# Altium footprint library NXP_60_26022015.PCBLIB: 287 footprints (part 15 of 18)
Each footprint in its own frame and in the unit in brackets; x right, y up, seen from the top. Pads: shape width x height; smd on the part's side, far side on the other; paste and mask are expansions set on the pad; w line width, h text height; cw(c..) or ccw(c..) is an arc to the next point about the centre after c.
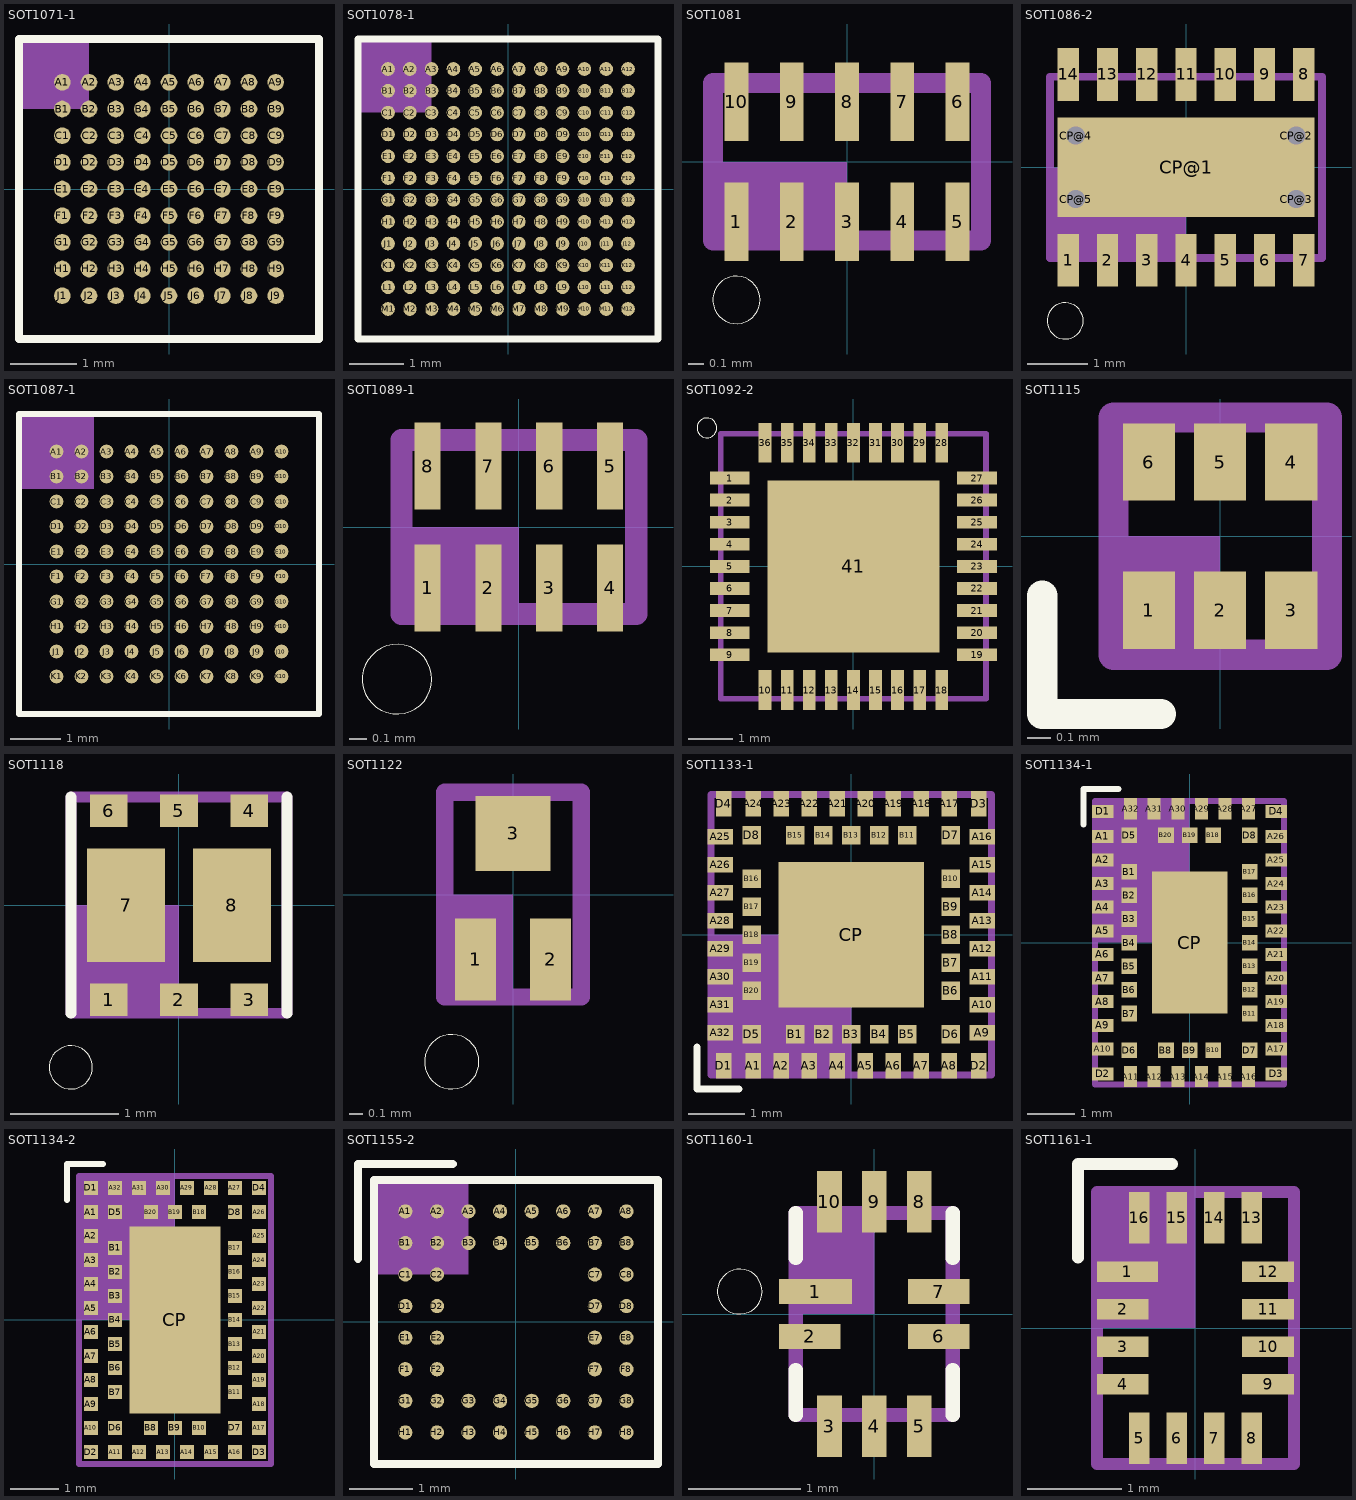
[diagram p14: the footprints below, top view; thin cyan lines are the x and y axes]

## SOT1071-1 [mil]
pads (81):
  rrect100% 9.84x9.84 smd: A1(-62.99,62.99) A2(-47.24,62.99) A3(-31.5,62.99) A4(-15.75,62.99) A5(0,62.99) A6(15.75,62.99) A7(31.5,62.99) A8(47.24,62.99) A9(62.99,62.99) B1(-62.99,47.24) B2(-47.24,47.24) B3(-31.5,47.24) B4(-15.75,47.24) B5(0,47.24) B6(15.75,47.24) B7(31.5,47.24) B8(47.24,47.24) B9(62.99,47.24) C1(-62.99,31.5) C2(-47.24,31.5) C3(-31.5,31.5) C4(-15.75,31.5) C5(0,31.5) C6(15.75,31.5) C7(31.5,31.5) C8(47.24,31.5) C9(62.99,31.5) D1(-62.99,15.75) D2(-47.24,15.75) D3(-31.5,15.75) D4(-15.75,15.75) D5(0,15.75) D6(15.75,15.75) D7(31.5,15.75) D8(47.24,15.75) D9(62.99,15.75) E1(-62.99,0) E2(-47.24,0) E3(-31.5,0) E4(-15.75,0) E5(0,0) E6(15.75,0) E7(31.5,0) E8(47.24,0) E9(62.99,0) F1(-62.99,-15.75) F2(-47.24,-15.75) F3(-31.5,-15.75) F4(-15.75,-15.75) F5(0,-15.75) F6(15.75,-15.75) F7(31.5,-15.75) F8(47.24,-15.75) F9(62.99,-15.75) G1(-62.99,-31.5) G2(-47.24,-31.5) G3(-31.5,-31.5) G4(-15.75,-31.5) G5(0,-31.5) G6(15.75,-31.5) G7(31.5,-31.5) G8(47.24,-31.5) G9(62.99,-31.5) H1(-62.99,-47.24) H2(-47.24,-47.24) H3(-31.5,-47.24) H4(-15.75,-47.24) H5(0,-47.24) H6(15.75,-47.24) H7(31.5,-47.24) H8(47.24,-47.24) H9(62.99,-47.24) J1(-62.99,-62.99) J2(-47.24,-62.99) J3(-31.5,-62.99) J4(-15.75,-62.99) J5(0,-62.99) J6(15.75,-62.99) J7(31.5,-62.99) J8(47.24,-62.99) J9(62.99,-62.99)
Top Overlay:
  lines w5: -88.58,-88.58 -88.58,88.58 88.58,88.58 88.58,-88.58 -88.58,-88.58
Top Paste:
  circle w0: c62.99,-62.99 r5.41
  circle w0: c62.99,-47.24 r5.41
  circle w0: c62.99,-31.5 r5.41
  circle w0: c62.99,-15.75 r5.41
  circle w0: c62.99,0 r5.41
  circle w0: c62.99,15.75 r5.41
  circle w0: c62.99,31.5 r5.41
  circle w0: c62.99,47.24 r5.41
  circle w0: c62.99,62.99 r5.41
  circle w0: c47.24,62.99 r5.41
  circle w0: c31.5,62.99 r5.41
  circle w0: c15.75,62.99 r5.41
  circle w0: c0,62.99 r5.41
  circle w0: c-15.75,62.99 r5.41
  circle w0: c-31.5,62.99 r5.41
  circle w0: c-47.24,62.99 r5.41
  circle w0: c-62.99,62.99 r5.41
  circle w0: c47.24,47.24 r5.41
  circle w0: c31.5,47.24 r5.41
  circle w0: c15.75,47.24 r5.41
  circle w0: c0,47.24 r5.41
  circle w0: c-15.75,47.24 r5.41
  circle w0: c-31.5,47.24 r5.41
  circle w0: c-47.24,47.24 r5.41
  circle w0: c-62.99,47.24 r5.41
  circle w0: c47.24,31.5 r5.41
  circle w0: c31.5,31.5 r5.41
  circle w0: c15.75,31.5 r5.41
  circle w0: c0,31.5 r5.41
  circle w0: c-15.75,31.5 r5.41
  circle w0: c-31.5,31.5 r5.41
  circle w0: c-47.24,31.5 r5.41
  circle w0: c-62.99,31.5 r5.41
  circle w0: c47.24,15.75 r5.41
  circle w0: c31.5,15.75 r5.41
  circle w0: c15.75,15.75 r5.41
  circle w0: c0,15.75 r5.41
  circle w0: c-15.75,15.75 r5.41
  circle w0: c-31.5,15.75 r5.41
  circle w0: c-47.24,15.75 r5.41
  circle w0: c-62.99,15.75 r5.41
  circle w0: c47.24,0 r5.41
  circle w0: c31.5,0 r5.41
  circle w0: c15.75,0 r5.41
  circle w0: c0,0 r5.41
  circle w0: c-15.75,0 r5.41
  circle w0: c-31.5,0 r5.41
  circle w0: c-47.24,0 r5.41
  circle w0: c-62.99,0 r5.41
  circle w0: c47.24,-15.75 r5.41
  circle w0: c31.5,-15.75 r5.41
  circle w0: c15.75,-15.75 r5.41
  circle w0: c0,-15.75 r5.41
  circle w0: c-15.75,-15.75 r5.41
  circle w0: c-31.5,-15.75 r5.41
  circle w0: c-47.24,-15.75 r5.41
  circle w0: c-62.99,-15.75 r5.41
  circle w0: c47.24,-31.5 r5.41
  circle w0: c31.5,-31.5 r5.41
  circle w0: c15.75,-31.5 r5.41
  circle w0: c0,-31.5 r5.41
  circle w0: c-15.75,-31.5 r5.41
  circle w0: c-31.5,-31.5 r5.41
  circle w0: c-47.24,-31.5 r5.41
  circle w0: c-62.99,-31.5 r5.41
  circle w0: c47.24,-47.24 r5.41
  circle w0: c31.5,-47.24 r5.41
  circle w0: c15.75,-47.24 r5.41
  circle w0: c0,-47.24 r5.41
  circle w0: c-15.75,-47.24 r5.41
  circle w0: c-31.5,-47.24 r5.41
  circle w0: c-47.24,-47.24 r5.41
  circle w0: c-62.99,-47.24 r5.41
  circle w0: c47.24,-62.99 r5.41
  circle w0: c31.5,-62.99 r5.41
  circle w0: c15.75,-62.99 r5.41
  circle w0: c0,-62.99 r5.41
  circle w0: c-15.75,-62.99 r5.41
  circle w0: c-31.5,-62.99 r5.41
  circle w0: c-47.24,-62.99 r5.41
  circle w0: c-62.99,-62.99 r5.41
Top Solder:
  circle w0: c-62.99,62.99 r6.89
  circle w0: c-47.24,62.99 r6.89
  circle w0: c-31.5,62.99 r6.89
  circle w0: c-15.75,62.99 r6.89
  circle w0: c0,62.99 r6.89
  circle w0: c15.75,62.99 r6.89
  circle w0: c31.5,62.99 r6.89
  circle w0: c47.24,62.99 r6.89
  circle w0: c-62.99,47.24 r6.89
  circle w0: c-47.24,47.24 r6.89
  circle w0: c-31.5,47.24 r6.89
  circle w0: c-15.75,47.24 r6.89
  circle w0: c0,47.24 r6.89
  circle w0: c15.75,47.24 r6.89
  circle w0: c31.5,47.24 r6.89
  circle w0: c47.24,47.24 r6.89
  circle w0: c-62.99,31.5 r6.89
  circle w0: c-62.99,15.75 r6.89
  circle w0: c-62.99,0 r6.89
  circle w0: c-62.99,-15.75 r6.89
  circle w0: c-62.99,-31.5 r6.89
  circle w0: c-62.99,-47.24 r6.89
  circle w0: c-47.24,31.5 r6.89
  circle w0: c-47.24,15.75 r6.89
  circle w0: c-47.24,0 r6.89
  circle w0: c-47.24,-15.75 r6.89
  circle w0: c-47.24,-31.5 r6.89
  circle w0: c-47.24,-47.24 r6.89
  circle w0: c-31.5,-31.5 r6.89
  circle w0: c-31.5,-47.24 r6.89
  circle w0: c-15.75,-31.5 r6.89
  circle w0: c-15.75,-47.24 r6.89
  circle w0: c0,-31.5 r6.89
  circle w0: c0,-47.24 r6.89
  circle w0: c15.75,-31.5 r6.89
  circle w0: c15.75,-47.24 r6.89
  circle w0: c31.5,-31.5 r6.89
  circle w0: c31.5,-47.24 r6.89
  circle w0: c47.24,-31.5 r6.89
  circle w0: c47.24,-47.24 r6.89
  circle w0: c31.5,31.5 r6.89
  circle w0: c31.5,15.75 r6.89
  circle w0: c47.24,31.5 r6.89
  circle w0: c47.24,15.75 r6.89
  circle w0: c31.5,0 r6.89
  circle w0: c31.5,-15.75 r6.89
  circle w0: c47.24,0 r6.89
  circle w0: c47.24,-15.75 r6.89
  circle w0: c62.99,62.99 r6.89
  circle w0: c62.99,47.24 r6.89
  circle w0: c62.99,-31.5 r6.89
  circle w0: c62.99,-47.24 r6.89
  circle w0: c62.99,31.5 r6.89
  circle w0: c62.99,15.75 r6.89
  circle w0: c62.99,0 r6.89
  circle w0: c62.99,-15.75 r6.89
  circle w0: c-62.99,-62.99 r6.89
  circle w0: c-31.5,31.5 r6.89
  circle w0: c-31.5,15.75 r6.89
  circle w0: c-31.5,0 r6.89
  circle w0: c-31.5,-15.75 r6.89
  circle w0: c-15.75,31.5 r6.89
  circle w0: c0,31.5 r6.89
  circle w0: c15.75,31.5 r6.89
  circle w0: c-15.75,15.75 r6.89
  circle w0: c-15.75,0 r6.89
  circle w0: c-15.75,-15.75 r6.89
  circle w0: c0,15.75 r6.89
  circle w0: c0,0 r6.89
  circle w0: c0,-15.75 r6.89
  circle w0: c15.75,15.75 r6.89
  circle w0: c15.75,0 r6.89
  circle w0: c15.75,-15.75 r6.89
  circle w0: c-47.24,-62.99 r6.89
  circle w0: c-31.5,-62.99 r6.89
  circle w0: c-15.75,-62.99 r6.89
  circle w0: c0,-62.99 r6.89
  circle w0: c15.75,-62.99 r6.89
  circle w0: c31.5,-62.99 r6.89
  circle w0: c47.24,-62.99 r6.89
  circle w0: c62.99,-62.99 r6.89
Mechanical 16:
  rectangle: -88.58,47.24 -47.24,88.58

## SOT1078-1 [mm]
pads (144):
  rrect100% 0.25x0.25 smd: A1(-2.2,2.2) A2(-1.8,2.2) A3(-1.4,2.2) A4(-1,2.2) A5(-0.6,2.2) A6(-0.2,2.2) A7(0.2,2.2) A8(0.6,2.2) A9(1,2.2) A10(1.4,2.2) A11(1.8,2.2) A12(2.2,2.2) B1(-2.2,1.8) B2(-1.8,1.8) B3(-1.4,1.8) B4(-1,1.8) B5(-0.6,1.8) B6(-0.2,1.8) B7(0.2,1.8) B8(0.6,1.8) B9(1,1.8) B10(1.4,1.8) B11(1.8,1.8) B12(2.2,1.8) C1(-2.2,1.4) C2(-1.8,1.4) C3(-1.4,1.4) C4(-1,1.4) C5(-0.6,1.4) C6(-0.2,1.4) C7(0.2,1.4) C8(0.6,1.4) C9(1,1.4) C10(1.4,1.4) C11(1.8,1.4) C12(2.2,1.4) D1(-2.2,1) D2(-1.8,1) D3(-1.4,1) D4(-1,1) D5(-0.6,1) D6(-0.2,1) D7(0.2,1) D8(0.6,1) D9(1,1) D10(1.4,1) D11(1.8,1) D12(2.2,1) E1(-2.2,0.6) E2(-1.8,0.6) E3(-1.4,0.6) E4(-1,0.6) E5(-0.6,0.6) E6(-0.2,0.6) E7(0.2,0.6) E8(0.6,0.6) E9(1,0.6) E10(1.4,0.6) E11(1.8,0.6) E12(2.2,0.6) F1(-2.2,0.2) F2(-1.8,0.2) F3(-1.4,0.2) F4(-1,0.2) F5(-0.6,0.2) F6(-0.2,0.2) F7(0.2,0.2) F8(0.6,0.2) F9(1,0.2) F10(1.4,0.2) F11(1.8,0.2) F12(2.2,0.2) G1(-2.2,-0.2) G2(-1.8,-0.2) G3(-1.4,-0.2) G4(-1,-0.2) G5(-0.6,-0.2) G6(-0.2,-0.2) G7(0.2,-0.2) G8(0.6,-0.2) G9(1,-0.2) G10(1.4,-0.2) G11(1.8,-0.2) G12(2.2,-0.2) H1(-2.2,-0.6) H2(-1.8,-0.6) H3(-1.4,-0.6) H4(-1,-0.6) H5(-0.6,-0.6) H6(-0.2,-0.6) H7(0.2,-0.6) H8(0.6,-0.6) H9(1,-0.6) H10(1.4,-0.6) H11(1.8,-0.6) H12(2.2,-0.6) J1(-2.2,-1) J2(-1.8,-1) J3(-1.4,-1) J4(-1,-1) J5(-0.6,-1) J6(-0.2,-1) J7(0.2,-1) J8(0.6,-1) J9(1,-1) J10(1.4,-1) J11(1.8,-1) J12(2.2,-1) K1(-2.2,-1.4) K2(-1.8,-1.4) K3(-1.4,-1.4) K4(-1,-1.4) K5(-0.6,-1.4) K6(-0.2,-1.4) K7(0.2,-1.4) K8(0.6,-1.4) K9(1,-1.4) K10(1.4,-1.4) K11(1.8,-1.4) K12(2.2,-1.4) L1(-2.2,-1.8) L2(-1.8,-1.8) L3(-1.4,-1.8) L4(-1,-1.8) L5(-0.6,-1.8) L6(-0.2,-1.8) L7(0.2,-1.8) L8(0.6,-1.8) L9(1,-1.8) L10(1.4,-1.8) L11(1.8,-1.8) L12(2.2,-1.8) M1(-2.2,-2.2) M2(-1.8,-2.2) M3(-1.4,-2.2) M4(-1,-2.2) M5(-0.6,-2.2) M6(-0.2,-2.2) M7(0.2,-2.2) M8(0.6,-2.2) M9(1,-2.2) M10(1.4,-2.2) M11(1.8,-2.2) M12(2.2,-2.2)
Top Overlay:
  lines w0.127: -2.75,-2.75 -2.75,2.75 2.75,2.75 2.75,-2.75 -2.75,-2.75
Top Paste:
  circle w0: c-2.2,2.2 r0.137
  circle w0: c-1.8,2.2 r0.137
  circle w0: c-1.4,2.2 r0.137
  circle w0: c-1,2.2 r0.137
  circle w0: c-0.6,2.2 r0.137
  circle w0: c-0.2,2.2 r0.137
  circle w0: c2.2,2.2 r0.137
  circle w0: c1.8,2.2 r0.137
  circle w0: c1.4,2.2 r0.137
  circle w0: c1,2.2 r0.137
  circle w0: c0.6,2.2 r0.137
  circle w0: c0.2,2.2 r0.137
  circle w0: c-2.2,1.8 r0.137
  circle w0: c-1.8,1.8 r0.137
  circle w0: c-1.4,1.8 r0.137
  circle w0: c-1,1.8 r0.137
  circle w0: c-0.6,1.8 r0.137
  circle w0: c-0.2,1.8 r0.137
  circle w0: c2.2,1.8 r0.137
  circle w0: c1.8,1.8 r0.137
  circle w0: c1.4,1.8 r0.137
  circle w0: c1,1.8 r0.137
  circle w0: c0.6,1.8 r0.137
  circle w0: c0.2,1.8 r0.137
  circle w0: c-2.2,1.4 r0.137
  circle w0: c-1.8,1.4 r0.137
  circle w0: c-1.4,1.4 r0.137
  circle w0: c-1,1.4 r0.137
  circle w0: c-0.6,1.4 r0.137
  circle w0: c-0.2,1.4 r0.137
  circle w0: c2.2,1.4 r0.137
  circle w0: c1.8,1.4 r0.137
  circle w0: c1.4,1.4 r0.137
  circle w0: c1,1.4 r0.137
  circle w0: c0.6,1.4 r0.137
  circle w0: c0.2,1.4 r0.137
  circle w0: c-2.2,1 r0.137
  circle w0: c-1.8,1 r0.137
  circle w0: c-1.4,1 r0.137
  circle w0: c-1,1 r0.137
  circle w0: c-0.6,1 r0.137
  circle w0: c-0.2,1 r0.137
  circle w0: c2.2,1 r0.137
  circle w0: c1.8,1 r0.137
  circle w0: c1.4,1 r0.137
  circle w0: c1,1 r0.137
  circle w0: c0.6,1 r0.137
  circle w0: c0.2,1 r0.137
  circle w0: c-2.2,0.6 r0.137
  circle w0: c-1.8,0.6 r0.137
  circle w0: c-1.4,0.6 r0.137
  circle w0: c-1,0.6 r0.137
  circle w0: c-0.6,0.6 r0.137
  circle w0: c-0.2,0.6 r0.137
  circle w0: c2.2,0.6 r0.137
  circle w0: c1.8,0.6 r0.137
  circle w0: c1.4,0.6 r0.137
  circle w0: c1,0.6 r0.137
  circle w0: c0.6,0.6 r0.137
  circle w0: c0.2,0.6 r0.137
  circle w0: c-2.2,0.2 r0.137
  circle w0: c-1.8,0.2 r0.137
  circle w0: c-1.4,0.2 r0.137
  circle w0: c-1,0.2 r0.137
  circle w0: c-0.6,0.2 r0.137
  circle w0: c-0.2,0.2 r0.137
  circle w0: c2.2,0.2 r0.137
  circle w0: c1.8,0.2 r0.137
  circle w0: c1.4,0.2 r0.137
  circle w0: c1,0.2 r0.137
  circle w0: c0.6,0.2 r0.137
  circle w0: c0.2,0.2 r0.137
  circle w0: c-2.2,-0.2 r0.137
  circle w0: c-1.8,-0.2 r0.137
  circle w0: c-1.4,-0.2 r0.137
  circle w0: c-1,-0.2 r0.137
  circle w0: c-0.6,-0.2 r0.137
  circle w0: c-0.2,-0.2 r0.137
  circle w0: c2.2,-0.2 r0.137
  circle w0: c1.8,-0.2 r0.137
  circle w0: c1.4,-0.2 r0.137
  circle w0: c1,-0.2 r0.137
  circle w0: c0.6,-0.2 r0.137
  circle w0: c0.2,-0.2 r0.137
  circle w0: c-2.2,-0.6 r0.137
  circle w0: c-1.8,-0.6 r0.137
  circle w0: c-1.4,-0.6 r0.137
  circle w0: c-1,-0.6 r0.137
  circle w0: c-0.6,-0.6 r0.137
  circle w0: c-0.2,-0.6 r0.137
  circle w0: c2.2,-0.6 r0.137
  circle w0: c1.8,-0.6 r0.137
  circle w0: c1.4,-0.6 r0.137
  circle w0: c1,-0.6 r0.137
  circle w0: c0.6,-0.6 r0.137
  circle w0: c0.2,-0.6 r0.137
  circle w0: c-2.2,-1 r0.137
  circle w0: c-1.8,-1 r0.137
  circle w0: c-1.4,-1 r0.137
  circle w0: c-1,-1 r0.137
  circle w0: c-0.6,-1 r0.137
  circle w0: c-0.2,-1 r0.137
  circle w0: c2.2,-1 r0.137
  circle w0: c1.8,-1 r0.137
  circle w0: c1.4,-1 r0.137
  circle w0: c1,-1 r0.137
  circle w0: c0.6,-1 r0.137
  circle w0: c0.2,-1 r0.137
  circle w0: c-2.2,-1.4 r0.137
  circle w0: c-1.8,-1.4 r0.137
  circle w0: c-1.4,-1.4 r0.137
  circle w0: c-1,-1.4 r0.137
  circle w0: c-0.6,-1.4 r0.137
  circle w0: c-0.2,-1.4 r0.137
  circle w0: c2.2,-1.4 r0.137
  circle w0: c1.8,-1.4 r0.137
  circle w0: c1.4,-1.4 r0.137
  circle w0: c1,-1.4 r0.137
  circle w0: c0.6,-1.4 r0.137
  circle w0: c0.2,-1.4 r0.137
  circle w0: c-2.2,-1.8 r0.137
  circle w0: c-1.8,-1.8 r0.137
  circle w0: c-1.4,-1.8 r0.137
  circle w0: c-1,-1.8 r0.137
  circle w0: c-0.6,-1.8 r0.137
  circle w0: c-0.2,-1.8 r0.137
  circle w0: c2.2,-1.8 r0.137
  circle w0: c1.8,-1.8 r0.137
  circle w0: c1.4,-1.8 r0.137
  circle w0: c1,-1.8 r0.137
  circle w0: c0.6,-1.8 r0.137
  circle w0: c0.2,-1.8 r0.137
  circle w0: c-2.2,-2.2 r0.137
  circle w0: c-1.8,-2.2 r0.137
  circle w0: c-1.4,-2.2 r0.137
  circle w0: c-1,-2.2 r0.137
  circle w0: c-0.6,-2.2 r0.137
  circle w0: c-0.2,-2.2 r0.137
  circle w0: c2.2,-2.2 r0.137
  circle w0: c1.8,-2.2 r0.137
  circle w0: c1.4,-2.2 r0.137
  circle w0: c1,-2.2 r0.137
  circle w0: c0.6,-2.2 r0.137
  circle w0: c0.2,-2.2 r0.137
Top Solder:
  circle w0: c-2.2,2.2 r0.175
  circle w0: c-1.8,2.2 r0.175
  circle w0: c-1.4,2.2 r0.175
  circle w0: c-1,2.2 r0.175
  circle w0: c-0.6,2.2 r0.175
  circle w0: c-0.2,2.2 r0.175
  circle w0: c0.2,2.2 r0.175
  circle w0: c0.6,2.2 r0.175
  circle w0: c-2.2,1.8 r0.175
  circle w0: c-1.8,1.8 r0.175
  circle w0: c-1.4,1.8 r0.175
  circle w0: c-1,1.8 r0.175
  circle w0: c-0.6,1.8 r0.175
  circle w0: c-0.2,1.8 r0.175
  circle w0: c0.2,1.8 r0.175
  circle w0: c0.6,1.8 r0.175
  circle w0: c-2.2,1.4 r0.175
  circle w0: c-2.2,1 r0.175
  circle w0: c-2.2,0.6 r0.175
  circle w0: c-2.2,0.2 r0.175
  circle w0: c-2.2,-0.2 r0.175
  circle w0: c-2.2,-0.6 r0.175
  circle w0: c-1.8,1.4 r0.175
  circle w0: c-1.8,1 r0.175
  circle w0: c-1.8,0.6 r0.175
  circle w0: c-1.8,0.2 r0.175
  circle w0: c-1.8,-0.2 r0.175
  circle w0: c-1.8,-0.6 r0.175
  circle w0: c-1.4,-0.2 r0.175
  circle w0: c-1.4,-0.6 r0.175
  circle w0: c-1,-0.2 r0.175
  circle w0: c-1,-0.6 r0.175
  circle w0: c-0.6,-0.2 r0.175
  circle w0: c-0.6,-0.6 r0.175
  circle w0: c-0.2,-0.2 r0.175
  circle w0: c-0.2,-0.6 r0.175
  circle w0: c0.2,-0.2 r0.175
  circle w0: c0.2,-0.6 r0.175
  circle w0: c0.6,-0.2 r0.175
  circle w0: c0.6,-0.6 r0.175
  circle w0: c0.2,1.4 r0.175
  circle w0: c0.2,1 r0.175
  circle w0: c0.6,1.4 r0.175
  circle w0: c0.6,1 r0.175
  circle w0: c0.2,0.6 r0.175
  circle w0: c0.2,0.2 r0.175
  circle w0: c0.6,0.6 r0.175
  circle w0: c0.6,0.2 r0.175
  circle w0: c1,2.2 r0.175
  circle w0: c1,1.8 r0.175
  circle w0: c1,-0.2 r0.175
  circle w0: c1,-0.6 r0.175
  circle w0: c1,1.4 r0.175
  circle w0: c1,1 r0.175
  circle w0: c1,0.6 r0.175
  circle w0: c1,0.2 r0.175
  circle w0: c-2.2,-1 r0.175
  circle w0: c-1.4,1.4 r0.175
  circle w0: c-1.4,1 r0.175
  circle w0: c-1.4,0.6 r0.175
  circle w0: c-1.4,0.2 r0.175
  circle w0: c-1,1.4 r0.175
  circle w0: c-0.6,1.4 r0.175
  circle w0: c-0.2,1.4 r0.175
  circle w0: c-1,1 r0.175
  circle w0: c-1,0.6 r0.175
  circle w0: c-1,0.2 r0.175
  circle w0: c-0.6,1 r0.175
  circle w0: c-0.6,0.6 r0.175
  circle w0: c-0.6,0.2 r0.175
  circle w0: c-0.2,1 r0.175
  circle w0: c-0.2,0.6 r0.175
  circle w0: c-0.2,0.2 r0.175
  circle w0: c1.4,2.2 r0.175
  circle w0: c1.8,2.2 r0.175
  circle w0: c1.4,1.8 r0.175
  circle w0: c1.8,1.8 r0.175
  circle w0: c1.4,-0.2 r0.175
  circle w0: c1.4,-0.6 r0.175
  circle w0: c1.8,-0.2 r0.175
  circle w0: c1.8,-0.6 r0.175
  circle w0: c1.4,1.4 r0.175
  circle w0: c1.4,1 r0.175
  circle w0: c1.8,1.4 r0.175
  circle w0: c1.8,1 r0.175
  circle w0: c1.4,0.6 r0.175
  circle w0: c1.4,0.2 r0.175
  circle w0: c1.8,0.6 r0.175
  circle w0: c1.8,0.2 r0.175
  circle w0: c2.2,2.2 r0.175
  circle w0: c2.2,1.8 r0.175
  circle w0: c2.2,-0.2 r0.175
  circle w0: c2.2,-0.6 r0.175
  circle w0: c2.2,1.4 r0.175
  circle w0: c2.2,1 r0.175
  circle w0: c2.2,0.6 r0.175
  circle w0: c2.2,0.2 r0.175
  circle w0: c-2.2,-1.4 r0.175
  circle w0: c-2.2,-1.8 r0.175
  circle w0: c-2.2,-2.2 r0.175
  circle w0: c-1.8,-1 r0.175
  circle w0: c-1.8,-1.4 r0.175
  circle w0: c-1.8,-1.8 r0.175
  circle w0: c-1.8,-2.2 r0.175
  circle w0: c-1.4,-1 r0.175
  circle w0: c-1.4,-1.4 r0.175
  circle w0: c-1.4,-1.8 r0.175
  circle w0: c-1.4,-2.2 r0.175
  circle w0: c-1,-1 r0.175
  circle w0: c-1,-1.4 r0.175
  circle w0: c-1,-1.8 r0.175
  circle w0: c-1,-2.2 r0.175
  circle w0: c-0.6,-1 r0.175
  circle w0: c-0.6,-1.4 r0.175
  circle w0: c-0.6,-1.8 r0.175
  circle w0: c-0.6,-2.2 r0.175
  circle w0: c-0.2,-1 r0.175
  circle w0: c-0.2,-1.4 r0.175
  circle w0: c-0.2,-1.8 r0.175
  circle w0: c-0.2,-2.2 r0.175
  circle w0: c0.2,-1 r0.175
  circle w0: c0.2,-1.4 r0.175
  circle w0: c0.2,-1.8 r0.175
  circle w0: c0.2,-2.2 r0.175
  circle w0: c0.6,-1 r0.175
  circle w0: c0.6,-1.4 r0.175
  circle w0: c0.6,-1.8 r0.175
  circle w0: c0.6,-2.2 r0.175
  circle w0: c1,-1 r0.175
  circle w0: c1,-1.4 r0.175
  circle w0: c1,-1.8 r0.175
  circle w0: c1,-2.2 r0.175
  circle w0: c1.4,-1 r0.175
  circle w0: c1.4,-1.4 r0.175
  circle w0: c1.4,-1.8 r0.175
  circle w0: c1.4,-2.2 r0.175
  circle w0: c1.8,-1 r0.175
  circle w0: c1.8,-1.4 r0.175
  circle w0: c1.8,-1.8 r0.175
  circle w0: c1.8,-2.2 r0.175
  circle w0: c2.2,-1 r0.175
  circle w0: c2.2,-1.4 r0.175
  circle w0: c2.2,-1.8 r0.175
  circle w0: c2.2,-2.2 r0.175
Mechanical 16:
  rectangle: -2.75,1.4 -1.4,2.75

## SOT1081 [mm]
pads (10):
  rect 0.15x0.5 smd: 1(-0.7,-0.38) 2(-0.35,-0.38) 3(0,-0.38) 4(0.35,-0.38) 5(0.7,-0.38) 6(0.7,0.38) 7(0.35,0.38) 8(0,0.38) 9(-0.35,0.38) 10(-0.7,0.38)
Top Overlay:
  circle w0: c-0.7,-0.875 r0.15
Top Solder:
  rectangle: -0.125,-0.68 0.125,-0.08
  rectangle: -0.475,-0.68 -0.225,-0.08
  rectangle: -0.825,-0.68 -0.575,-0.08
  rectangle: -0.125,0.08 0.125,0.68
  rectangle: -0.475,0.08 -0.225,0.68
  rectangle: -0.825,0.08 -0.575,0.68
  rectangle: 0.225,0.08 0.475,0.68
  rectangle: 0.575,0.08 0.825,0.68
  rectangle: 0.225,-0.68 0.475,-0.08
  rectangle: 0.575,-0.68 0.825,-0.08
Mechanical 16:
  rectangle: -0.85,-0.5 0,0
  lines w0.127: -0.85,-0.5 0.85,-0.5 0.85,0.5 -0.85,0.5 -0.85,-0.5
  text "SOT1081-1" at -0.5,1 h0.17

## SOT1086-2 [mm]
pads (19):
  rect 0.35x0.875 smd: 1(-1.95,-1.537) 2(-1.3,-1.537) 3(-0.65,-1.537) 4(0,-1.537) 5(0.65,-1.537) 6(1.3,-1.537) 7(1.95,-1.537) 8(1.95,1.537) 9(1.3,1.537) 10(0.65,1.537) 11(0,1.537) 12(-0.65,1.537) 13(-1.3,1.537) 14(-1.95,1.537)
  rect 4.25x1.65 smd: CP@1(0,0)
  round 0.6 hole 0.3: CP@2(1.825,0.525) CP@3(1.825,-0.525) CP@4(-1.825,0.525) CP@5(-1.825,-0.525)
Top Overlay:
  circle w0: c-2,-2.54 r0.3
Top Paste:
  rectangle: 0.175,-0.325 1.175,0.325
  rectangle: -1.175,-0.325 -0.175,0.325
Mechanical 16:
  rectangle: -2.25,-1.5 0,0
  lines w0.127: -2.25,-1.5 2.25,-1.5 2.25,1.5 -2.25,1.5 -2.25,-1.5

## SOT1087-1 [mm]
pads (100):
  rrect100% 0.275x0.275 smd: A1(-2.25,2.25) A2(-1.75,2.25) A3(-1.25,2.25) A4(-0.75,2.25) A5(-0.25,2.25) A6(0.25,2.25) A7(0.75,2.25) A8(1.25,2.25) A9(1.75,2.25) A10(2.25,2.25) B1(-2.25,1.75) B2(-1.75,1.75) B3(-1.25,1.75) B4(-0.75,1.75) B5(-0.25,1.75) B6(0.25,1.75) B7(0.75,1.75) B8(1.25,1.75) B9(1.75,1.75) B10(2.25,1.75) C1(-2.25,1.25) C2(-1.75,1.25) C3(-1.25,1.25) C4(-0.75,1.25) C5(-0.25,1.25) C6(0.25,1.25) C7(0.75,1.25) C8(1.25,1.25) C9(1.75,1.25) C10(2.25,1.25) D1(-2.25,0.75) D2(-1.75,0.75) D3(-1.25,0.75) D4(-0.75,0.75) D5(-0.25,0.75) D6(0.25,0.75) D7(0.75,0.75) D8(1.25,0.75) D9(1.75,0.75) D10(2.25,0.75) E1(-2.25,0.25) E2(-1.75,0.25) E3(-1.25,0.25) E4(-0.75,0.25) E5(-0.25,0.25) E6(0.25,0.25) E7(0.75,0.25) E8(1.25,0.25) E9(1.75,0.25) E10(2.25,0.25) F1(-2.25,-0.25) F2(-1.75,-0.25) F3(-1.25,-0.25) F4(-0.75,-0.25) F5(-0.25,-0.25) F6(0.25,-0.25) F7(0.75,-0.25) F8(1.25,-0.25) F9(1.75,-0.25) F10(2.25,-0.25) G1(-2.25,-0.75) G2(-1.75,-0.75) G3(-1.25,-0.75) G4(-0.75,-0.75) G5(-0.25,-0.75) G6(0.25,-0.75) G7(0.75,-0.75) G8(1.25,-0.75) G9(1.75,-0.75) G10(2.25,-0.75) H1(-2.25,-1.25) H2(-1.75,-1.25) H3(-1.25,-1.25) H4(-0.75,-1.25) H5(-0.25,-1.25) H6(0.25,-1.25) H7(0.75,-1.25) H8(1.25,-1.25) H9(1.75,-1.25) H10(2.25,-1.25) J1(-2.25,-1.75) J2(-1.75,-1.75) J3(-1.25,-1.75) J4(-0.75,-1.75) J5(-0.25,-1.75) J6(0.25,-1.75) J7(0.75,-1.75) J8(1.25,-1.75) J9(1.75,-1.75) J10(2.25,-1.75) K1(-2.25,-2.25) K2(-1.75,-2.25) K3(-1.25,-2.25) K4(-0.75,-2.25) K5(-0.25,-2.25) K6(0.25,-2.25) K7(0.75,-2.25) K8(1.25,-2.25) K9(1.75,-2.25) K10(2.25,-2.25)
Top Overlay:
  lines w0.127: -3,-3 3,-3 3,3 -3,3 -3,-3
Top Paste:
  rectangle: -2.4,2.1 -2.1,2.4
  rectangle: -1.9,2.1 -1.6,2.4
  rectangle: -2.4,1.6 -2.1,1.9
  rectangle: -1.9,1.6 -1.6,1.9
  rectangle: -2.4,1.1 -2.1,1.4
  rectangle: -1.9,1.1 -1.6,1.4
  rectangle: -2.4,0.6 -2.1,0.9
  rectangle: -1.9,0.6 -1.6,0.9
  rectangle: -2.4,0.1 -2.1,0.4
  rectangle: -1.9,0.1 -1.6,0.4
  rectangle: -2.4,-0.4 -2.1,-0.1
  rectangle: -1.9,-0.4 -1.6,-0.1
  rectangle: -2.4,-0.9 -2.1,-0.6
  rectangle: -1.9,-0.9 -1.6,-0.6
  rectangle: -2.4,-1.4 -2.1,-1.1
  rectangle: -1.9,-1.4 -1.6,-1.1
  rectangle: -2.4,-1.9 -2.1,-1.6
  rectangle: -1.9,-1.9 -1.6,-1.6
  rectangle: -2.4,-2.4 -2.1,-2.1
  rectangle: -1.9,-2.4 -1.6,-2.1
  rectangle: -1.4,2.1 -1.1,2.4
  rectangle: -0.9,2.1 -0.6,2.4
  rectangle: -1.4,1.6 -1.1,1.9
  rectangle: -0.9,1.6 -0.6,1.9
  rectangle: -1.4,1.1 -1.1,1.4
  rectangle: -0.9,1.1 -0.6,1.4
  rectangle: -1.4,0.6 -1.1,0.9
  rectangle: -0.9,0.6 -0.6,0.9
  rectangle: -1.4,0.1 -1.1,0.4
  rectangle: -0.9,0.1 -0.6,0.4
  rectangle: -1.4,-0.4 -1.1,-0.1
  rectangle: -0.9,-0.4 -0.6,-0.1
  rectangle: -1.4,-0.9 -1.1,-0.6
  rectangle: -0.9,-0.9 -0.6,-0.6
  rectangle: -1.4,-1.4 -1.1,-1.1
  rectangle: -0.9,-1.4 -0.6,-1.1
  rectangle: -1.4,-1.9 -1.1,-1.6
  rectangle: -0.9,-1.9 -0.6,-1.6
  rectangle: -1.4,-2.4 -1.1,-2.1
  rectangle: -0.9,-2.4 -0.6,-2.1
  rectangle: -0.4,2.1 -0.1,2.4
  rectangle: 0.1,2.1 0.4,2.4
  rectangle: -0.4,1.6 -0.1,1.9
  rectangle: 0.1,1.6 0.4,1.9
  rectangle: -0.4,1.1 -0.1,1.4
  rectangle: 0.1,1.1 0.4,1.4
  rectangle: -0.4,0.6 -0.1,0.9